# Altium footprint library PcbLibLafe.PcbLib: 297 footprints (part 13 of 19)
Each footprint in its own frame and in the unit in brackets; x right, y up, seen from the top. Pads: shape width x height; smd on the part's side, far side on the other; paste and mask are expansions set on the pad; w line width, h text height; cw(c..) or ccw(c..) is an arc to the next point about the centre after c.
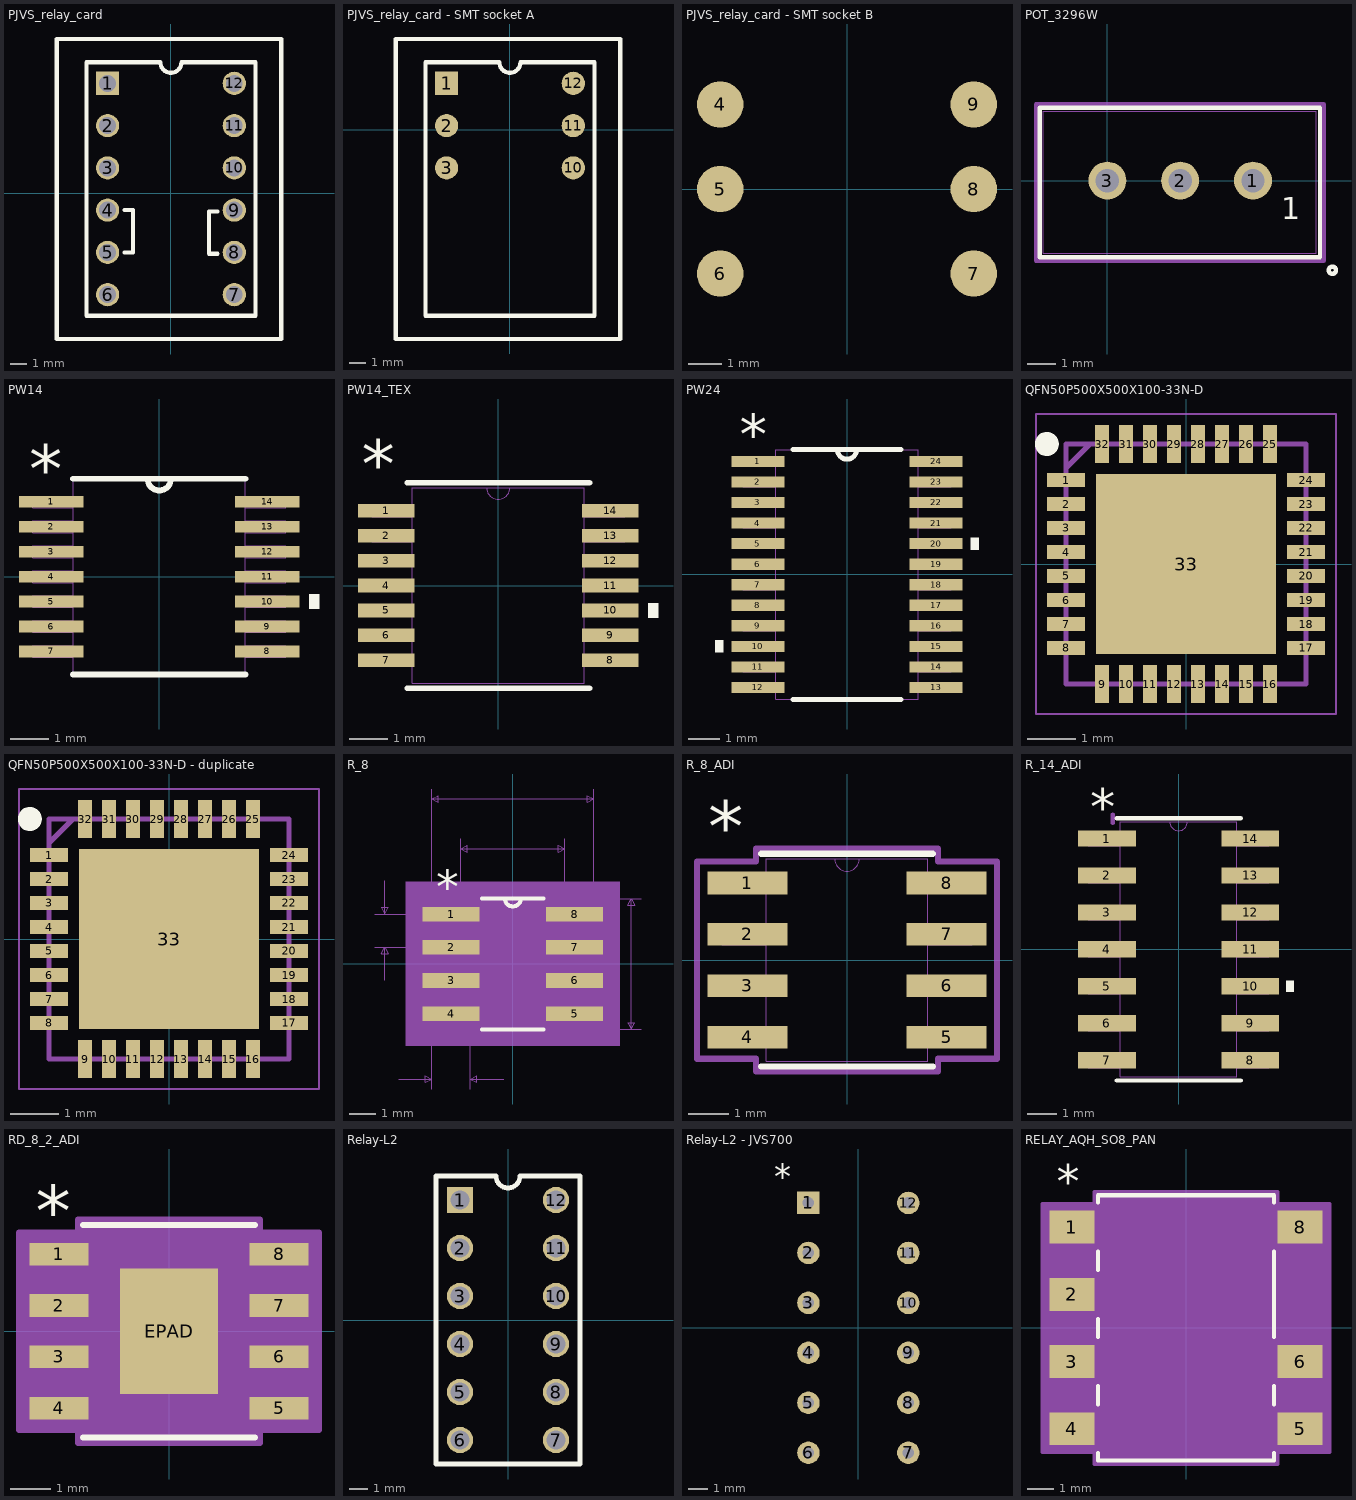
[diagram p12: the footprints below, top view; thin cyan lines are the x and y axes]

## PJVS_relay_card [mil] "PJVS relay card"
pads (12):
  rect 55x55 hole 40: 1(-150,260)
  round 55 hole 40: 2(-150,160) 3(-150,60) 4(-150,-40) 5(-150,-140) 6(-150,-240) 7(150,-240) 8(150,-140) 9(150,-40) 10(150,60) 11(150,160) 12(150,260)
Top Overlay:
  lines w10: -110,-140 -90,-140 -90,-40 -110,-40 ; 110,-143 90,-143 90,-43 110,-43 ; -270,-345 -270,365 261,365 261,-345 -270,-345 ; -200,-290 -200,310 -25,310 ccw(c0,310) 25,310 200,310 200,-290 -200,-290
3D body "110-87-312-41-001101.stp": height 110.28, standoff -179.92, extent -199.21,-294.92 198.43,303.5
3D body "relay_daughter_assm.SLDPRT": height 615.21, standoff -13.4, extent -272,-343 258,367

## PJVS_relay_card - SMT socket A [mil] "PJVS relay card"
pads (6):
  rect 55x55 smd: 1(-150,110)
  round 55 smd: 2(-150,10) 3(-150,-90) 10(150,-90) 11(150,10) 12(150,110)
Top Overlay:
  lines w10: -270,-495 261,-495 261,215 -270,215 -270,-495 ; -200,-440 200,-440 200,160 25,160 cw(c0,160) -25,160 -200,160 -200,-440
3D body "relay_daughter_assm.SLDPRT": height 615.21, standoff -13.4, extent -272,-493 258,217
3D body "110-87-312-41-001101.stp": height 110.28, standoff -179.92, extent -199.21,-444.92 198.43,153.5

## PJVS_relay_card - SMT socket B [mil] "PJVS relay card"
pads (6):
  round 55 smd: 4(-150,100) 5(-150,0) 6(-150,-100) 7(150,-100) 8(150,0) 9(150,100)

## POT_3296W [mil]
pads (3):
  round 52 hole 32 mask+0: 1(200,0) 2(100,0) 3(0,0)
Top Overlay:
  circle w6: c309,-123 r5
  lines w6: -93,-105 -93,100 292,100 292,-105 -93,-105
  text "1" at 239,-53 h30
Mechanical 13:
  lines w1: -88,-100 -88,95 287,95 287,-100 -88,-100
Mechanical 15:
  lines w6: -98,-110 297,-110 297,105 -98,105 -98,-110
3D body "POT_3296W.step": height 402.99, standoff -225, extent -103,-96 272,99
3D body: height 10, standoff 0, extent 0,0 10,10

## PW14 [mil]
pads (14):
  rect 66x12 smd mask+3: 1(-111,76.77) 2(-111,51.18) 3(-111,25.59) 4(-111,0) 5(-111,-25.59) 6(-111,-51.18) 7(-111,-76.77) 8(111,-76.77) 9(111,-51.18) 10(111,-25.59) 11(111,0) 12(111,25.59) 13(111,51.18) 14(111,76.77)
Top Overlay:
  region: 154,-18.09 164,-18.09 164,-33.09 154,-33.09
  lines w6: -88.5,-100.5 88.5,-100.5 ; -88.5,100.5 88.5,100.5 ; -12,100.5 ccw(c0,100.5) 12,100.5
  text "*" at -133.5,85.77 h50
Mechanical 13:
  lines w0: -12,100.5 ccw(c0,100.5) 12,100.5
  lines w1: -130,-82.77 -130,-70.77 -88.5,-70.77 -88.5,-82.77 -130,-82.77 ; -130,-57.18 -130,-45.18 -88.5,-45.18 -88.5,-57.18 -130,-57.18 ; -130,-31.59 -130,-19.59 -88.5,-19.59 -88.5,-31.59 -130,-31.59 ; -130,-6 -130,6 -88.5,6 -88.5,-6 -130,-6 ; -130,19.59 -130,31.59 -88.5,31.59 -88.5,19.59 -130,19.59 ; -130,45.18 -130,57.18 -88.5,57.18 -88.5,45.18 -130,45.18 ; -130,70.77 -130,82.77 -88.5,82.77 -88.5,70.77 -130,70.77 ; -88.5,-100.5 88.5,-100.5 88.5,100.5 -88.5,100.5 -88.5,-100.5 ; 88.5,-82.77 88.5,-70.77 130,-70.77 130,-82.77 88.5,-82.77 ; 88.5,-57.18 88.5,-45.18 130,-45.18 130,-57.18 88.5,-57.18 ; 88.5,-31.59 88.5,-19.59 130,-19.59 130,-31.59 88.5,-31.59 ; 88.5,-6 88.5,6 130,6 130,-6 88.5,-6 ; 88.5,19.59 88.5,31.59 130,31.59 130,19.59 88.5,19.59 ; 88.5,45.18 88.5,57.18 130,57.18 130,45.18 88.5,45.18 ; 88.5,70.77 88.5,82.77 130,82.77 130,70.77 88.5,70.77
  text "*" at -133.5,85.77 h50
3D body: height 10, standoff 0, extent 0,0 10,10
3D body "PW0014A.stp": height 44.49, standoff 0, extent -125.98,-98.42 125.99,98.43

## PW14_TEX [mil]
pads (14):
  rect 58x14 smd paste+0 mask+0: 1(-115,76.77) 2(-115,51.18) 3(-115,25.59) 4(-115,0) 5(-115,-25.59) 6(-115,-51.18) 7(-115,-76.77) 8(115,-76.77) 9(115,-51.18) 10(115,-25.59) 11(115,0) 12(115,25.59) 13(115,51.18) 14(115,76.77)
Top Overlay:
  region: 154,-18.09 164,-18.09 164,-33.09 154,-33.09
  lines w6: -93.5,-105.5 93.5,-105.5 ; -93.5,105.5 93.5,105.5
  text "*" at -140,100 h50
Mechanical 13:
  lines w0: -12,100.5 ccw(c0,100.5) 12,100.5
  lines w1: -130,-82.77 -88.5,-82.77 -88.5,-70.77 -130,-70.77 -130,-82.77 ; -130,-57.18 -88.5,-57.18 -88.5,-45.18 -130,-45.18 -130,-57.18 ; -130,-31.59 -88.5,-31.59 -88.5,-19.59 -130,-19.59 -130,-31.59 ; -130,-6 -88.5,-6 -88.5,6 -130,6 -130,-6 ; -130,19.59 -88.5,19.59 -88.5,31.59 -130,31.59 -130,19.59 ; -130,45.18 -88.5,45.18 -88.5,57.18 -130,57.18 -130,45.18 ; -130,70.77 -88.5,70.77 -88.5,82.77 -130,82.77 -130,70.77 ; -88.5,-100.5 -88.5,100.5 88.5,100.5 88.5,-100.5 -88.5,-100.5 ; 88.5,-82.77 130,-82.77 130,-70.77 88.5,-70.77 88.5,-82.77 ; 88.5,-57.18 130,-57.18 130,-45.18 88.5,-45.18 88.5,-57.18 ; 88.5,-31.59 130,-31.59 130,-19.59 88.5,-19.59 88.5,-31.59 ; 88.5,-6 130,-6 130,6 88.5,6 88.5,-6 ; 88.5,19.59 130,19.59 130,31.59 88.5,31.59 88.5,19.59 ; 88.5,45.18 130,45.18 130,57.18 88.5,57.18 88.5,45.18 ; 88.5,70.77 130,70.77 130,82.77 88.5,82.77 88.5,70.77
3D body "PW14_TEX.step": height 47.09, standoff 0, extent -130,-100.51 130,100.51

## PW24 [mil]
pads (24):
  rect 66x14 smd: 1(-111,140.75) 2(-111,115.16) 3(-111,89.57) 4(-111,63.98) 5(-111,38.39) 6(-111,12.8) 7(-111,-12.8) 8(-111,-38.39) 9(-111,-63.98) 10(-111,-89.57) 11(-111,-115.16) 12(-111,-140.75) 13(111,-140.75) 14(111,-115.16) 15(111,-89.57) 16(111,-63.98) 17(111,-38.39) 18(111,-12.8) 19(111,12.8) 20(111,38.39) 21(111,63.98) 22(111,89.57) 23(111,115.16) 24(111,140.75)
Top Overlay:
  region: -154,-82.07 -164,-82.07 -164,-97.07 -154,-97.07
  region: 154,45.89 164,45.89 164,30.89 154,30.89
  lines w6: -67.44,-155.5 67.44,-155.5 ; -67.44,155.5 67.44,155.5 ; -12,155.5 ccw(c0,155.5) 12,155.5
  text "*" at -133.5,149.75 h50
Mechanical 13:
  lines w0: -12,155.5 ccw(c0,155.5) 12,155.5
  lines w1: -130,-146.75 -130,-134.75 -88.5,-134.75 -88.5,-146.75 -130,-146.75 ; -130,-121.16 -130,-109.16 -88.5,-109.16 -88.5,-121.16 -130,-121.16 ; -130,-95.57 -130,-83.57 -88.5,-83.57 -88.5,-95.57 -130,-95.57 ; -130,-69.98 -130,-57.98 -88.5,-57.98 -88.5,-69.98 -130,-69.98 ; -130,-44.39 -130,-32.39 -88.5,-32.39 -88.5,-44.39 -130,-44.39 ; -130,-18.8 -130,-6.8 -88.5,-6.8 -88.5,-18.8 -130,-18.8 ; -130,6.8 -130,18.8 -88.5,18.8 -88.5,6.8 -130,6.8 ; -130,32.39 -130,44.39 -88.5,44.39 -88.5,32.39 -130,32.39 ; -130,57.98 -130,69.98 -88.5,69.98 -88.5,57.98 -130,57.98 ; -130,83.57 -130,95.57 -88.5,95.57 -88.5,83.57 -130,83.57 ; -130,109.16 -130,121.16 -88.5,121.16 -88.5,109.16 -130,109.16 ; -130,134.75 -130,146.75 -88.5,146.75 -88.5,134.75 -130,134.75 ; -88.5,-155.5 88.5,-155.5 88.5,155.5 -88.5,155.5 -88.5,-155.5 ; 88.5,-146.75 88.5,-134.75 130,-134.75 130,-146.75 88.5,-146.75 ; 88.5,-121.16 88.5,-109.16 130,-109.16 130,-121.16 88.5,-121.16 ; 88.5,-95.57 88.5,-83.57 130,-83.57 130,-95.57 88.5,-95.57 ; 88.5,-69.98 88.5,-57.98 130,-57.98 130,-69.98 88.5,-69.98 ; 88.5,-44.39 88.5,-32.39 130,-32.39 130,-44.39 88.5,-44.39 ; 88.5,-18.8 88.5,-6.8 130,-6.8 130,-18.8 88.5,-18.8 ; 88.5,6.8 88.5,18.8 130,18.8 130,6.8 88.5,6.8 ; 88.5,32.39 88.5,44.39 130,44.39 130,32.39 88.5,32.39 ; 88.5,57.98 88.5,69.98 130,69.98 130,57.98 88.5,57.98 ; 88.5,83.57 88.5,95.57 130,95.57 130,83.57 88.5,83.57 ; 88.5,109.16 88.5,121.16 130,121.16 130,109.16 88.5,109.16 ; 88.5,134.75 88.5,146.75 130,146.75 130,134.75 88.5,134.75
  text "*" at -133.5,149.75 h50
3D body: height 10, standoff 0, extent 0,0 10,10
3D body "PW0024A.stp": height 44.49, standoff 0, extent -125.97,-153.53 125.99,153.55

## QFN50P500X500X100-33N-D [mm]
pads (33):
  rect 0.8x0.3 smd: 1(-2.5,1.75) 2(-2.5,1.25) 3(-2.5,0.75) 4(-2.5,0.25) 5(-2.5,-0.25) 6(-2.5,-0.75) 7(-2.5,-1.25) 8(-2.5,-1.75) 17(2.5,-1.75) 18(2.5,-1.25) 19(2.5,-0.75) 20(2.5,-0.25) 21(2.5,0.25) 22(2.5,0.75) 23(2.5,1.25) 24(2.5,1.75)
  rect 0.3x0.8 smd: 9(-1.75,-2.5) 10(-1.25,-2.5) 11(-0.75,-2.5) 12(-0.25,-2.5) 13(0.25,-2.5) 14(0.75,-2.5) 15(1.25,-2.5) 16(1.75,-2.5) 25(1.75,2.5) 26(1.25,2.5) 27(0.75,2.5) 28(0.25,2.5) 29(-0.25,2.5) 30(-0.75,2.5) 31(-1.25,2.5) 32(-1.75,2.5)
  rect 3.75x3.75 smd: 33(0,0)
Top Overlay:
  circle w0.25: c-2.9,2.5 r0.125
Mechanical 13:
  lines w0.1: -2.5,2 -2,2.5 ; -2.5,-2.5 2.5,-2.5 2.5,2.5 -2.5,2.5 -2.5,-2.5
Mechanical 15:
  lines w0.05: -3.125,-3.125 3.125,-3.125 3.125,3.125 -3.125,3.125 -3.125,-3.125
3D body "AD3551RBCPZ16.stp": height 1, standoff 0, extent -2.55,-2.55 2.55,2.55

## QFN50P500X500X100-33N-D - duplicate [mm]
pads (33):
  rect 0.8x0.3 smd: 1(-2.5,1.75) 2(-2.5,1.25) 3(-2.5,0.75) 4(-2.5,0.25) 5(-2.5,-0.25) 6(-2.5,-0.75) 7(-2.5,-1.25) 8(-2.5,-1.75) 17(2.5,-1.75) 18(2.5,-1.25) 19(2.5,-0.75) 20(2.5,-0.25) 21(2.5,0.25) 22(2.5,0.75) 23(2.5,1.25) 24(2.5,1.75)
  rect 0.3x0.8 smd: 9(-1.75,-2.5) 10(-1.25,-2.5) 11(-0.75,-2.5) 12(-0.25,-2.5) 13(0.25,-2.5) 14(0.75,-2.5) 15(1.25,-2.5) 16(1.75,-2.5) 25(1.75,2.5) 26(1.25,2.5) 27(0.75,2.5) 28(0.25,2.5) 29(-0.25,2.5) 30(-0.75,2.5) 31(-1.25,2.5) 32(-1.75,2.5)
  rect 3.75x3.75 smd: 33(0,0)
Top Overlay:
  circle w0.25: c-2.9,2.5 r0.125
Mechanical 15:
  lines w0.1: -2.5,2 -2,2.5 ; -2.5,-2.5 -2.5,2.5 2.5,2.5 2.5,-2.5 -2.5,-2.5
Mechanical 20:
  lines w0.05: -3.125,-3.125 -3.125,3.125 3.125,3.125 3.125,-3.125 -3.125,-3.125

## R_8 [mil]
pads (8):
  rect 86x22 smd mask+0: 1(-93,75) 2(-93,25) 3(-93,-25) 4(-93,-75) 5(93,-75) 6(93,-25) 7(93,25) 8(93,75)
Top Overlay:
  lines w6: -46.43,-98.5 46.43,-98.5 ; -46.43,98.5 46.43,98.5 ; -12,98.5 ccw(c0,98.5) 12,98.5
  text "*" at -115.5,92 h50
Mechanical 5:
  region: 161,-123.5 -161,-123.5 -161,123.5 161,123.5
Mechanical 7:
  lines w1: -208,25 -93,25 ; -208,75 -93,75 ; -193,-25 -193,25 ; -193,125 -193,75 ; -172,-173.5 -122,-173.5 ; -122,-188.5 -122,0 -122,263.5 ; -78.5,0 -78.5,188.5 ; -64,-188.5 -64,0 ; -14,-173.5 -64,-173.5 ; 0,-98.5 193.5,-98.5 ; 0,98.5 193.5,98.5 ; 78.5,0 78.5,188.5 ; 122,0 122,263.5 ; -193,25 -188,15 -198,15 -193,25 ; -193,75 -188,85 -198,85 -193,75 ; -122,-173.5 -132,-178.5 -132,-168.5 -122,-173.5 ; -122,248.5 -112,243.5 -112,253.5 -122,248.5 ; -122,248.5 122,248.5 ; -78.5,173.5 -68.5,168.5 -68.5,178.5 -78.5,173.5 ; -78.5,173.5 78.5,173.5 ; -64,-173.5 -54,-178.5 -54,-168.5 -64,-173.5 ; 78.5,173.5 68.5,168.5 68.5,178.5 78.5,173.5 ; 122,248.5 112,243.5 112,253.5 122,248.5 ; 178.5,-98.5 183.5,-88.5 173.5,-88.5 178.5,-98.5 ; 178.5,-98.5 178.5,98.5 ; 178.5,98.5 183.5,88.5 173.5,88.5 178.5,98.5
  text ".05in/1.27mm" at -168,-218.5 h25
  text ".05in/1.27mm" at -363,37.5 h25
  text ".197in/5.004mm" at 198.5,-12.5 h25
  text ".244in/6.198mm" at -87.5,268.5 h25
  text ".157in/3.988mm" at -87.5,193.5 h25
  text "Alt 2 Padstyle: OX90Y60D30P" at -337.5,-523.5 h50
  text "Alt 1 Padstyle: OX60Y90D30P" at -337.5,-448.5 h50
  text "Pin One Padstyle: RX86Y22D0TSM2" at -387.5,-373.5 h50
  text "Default Padstyle: RX86Y22D0TSM2" at -387.5,-298.5 h50
Mechanical 13:
  lines w0: -12,98.5 ccw(c0,98.5) 12,98.5
  lines w1: -122,-85 -78.5,-85 -78.5,-65 -122,-65 -122,-85 ; -122,-35 -78.5,-35 -78.5,-15 -122,-15 -122,-35 ; -122,15 -78.5,15 -78.5,35 -122,35 -122,15 ; -122,65 -78.5,65 -78.5,85 -122,85 -122,65 ; -78.5,-98.5 -78.5,98.5 78.5,98.5 78.5,-98.5 -78.5,-98.5 ; 78.5,-85 122,-85 122,-65 78.5,-65 78.5,-85 ; 78.5,-35 122,-35 122,-15 78.5,-15 78.5,-35 ; 78.5,15 122,15 122,35 78.5,35 78.5,15 ; 78.5,65 122,65 122,85 78.5,85 78.5,65
  text "*" at -115.5,92 h50
Mechanical 15:
  region: 146,-108.5 -146,-108.5 -146,108.5 146,108.5
  lines w6: -146,-108.5 146,-108.5 146,108.5 -146,108.5 -146,-108.5
3D body: height 10, standoff 0, extent 0,0 10,10

## R_8_ADI [mil]
pads (8):
  rect 78x22 smd paste+0 mask+0: 1(-97,75) 2(-97,25) 3(-97,-25) 4(-97,-75) 5(97,-75) 6(97,-25) 7(97,25) 8(97,75)
Top Overlay:
  lines w6: -83.5,-103.5 83.5,-103.5 ; -83.5,103.5 83.5,103.5
  text "*" at -135,105 h50
Mechanical 13:
  lines w0: -12,98.5 ccw(c0,98.5) 12,98.5
  lines w1: -122,-85 -122,-65 -78.5,-65 -78.5,-85 -122,-85 ; -122,-35 -122,-15 -78.5,-15 -78.5,-35 -122,-35 ; -122,15 -122,35 -78.5,35 -78.5,15 -122,15 ; -122,65 -122,85 -78.5,85 -78.5,65 -122,65 ; -78.5,-98.5 78.5,-98.5 78.5,98.5 -78.5,98.5 -78.5,-98.5 ; 78.5,-85 78.5,-65 122,-65 122,-85 78.5,-85 ; 78.5,-35 78.5,-15 122,-15 122,-35 78.5,-35 ; 78.5,15 78.5,35 122,35 122,15 78.5,15 ; 78.5,65 78.5,85 122,85 122,65 78.5,65
  text "*" at -76,45.5 h50
Mechanical 15:
  lines w6: -146,-96 -146,96 -88.5,96 -88.5,108.5 88.5,108.5 88.5,96 146,96 146,-96 88.5,-96 88.5,-108.5 -88.5,-108.5 -88.5,-96 -146,-96
3D body "R_8_ADI.step": height 69.09, standoff 0, extent -122.01,-98.5 122.01,98.5

## R_14_ADI [mil]
pads (14):
  rect 78x22 smd paste+0 mask+0: 1(-97,150) 2(-97,100) 3(-97,50) 4(-97,0) 5(-97,-50) 6(-97,-100) 7(-97,-150) 8(97,-150) 9(97,-100) 10(97,-50) 11(97,0) 12(97,50) 13(97,100) 14(97,150)
Top Overlay:
  region: 146,-42.5 156,-42.5 156,-57.5 146,-57.5
  lines w6: -84,-177.5 84,-177.5 ; -84,177.5 84,177.5
  text "*" at -119.5,167 h50
Mechanical 13:
  lines w0: -12,172.5 ccw(c0,172.5) 12,172.5
  lines w1: -122,-160 -122,-140 -79,-140 -79,-160 -122,-160 ; -122,-110 -122,-90 -79,-90 -79,-110 -122,-110 ; -122,-60 -122,-40 -79,-40 -79,-60 -122,-60 ; -122,-10 -122,10 -79,10 -79,-10 -122,-10 ; -122,40 -122,60 -79,60 -79,40 -122,40 ; -122,90 -122,110 -79,110 -79,90 -122,90 ; -122,140 -122,160 -79,160 -79,140 -122,140 ; -79,-172.5 79,-172.5 79,172.5 -79,172.5 -79,-172.5 ; 79,-160 79,-140 122,-140 122,-160 79,-160 ; 79,-110 79,-90 122,-90 122,-110 79,-110 ; 79,-60 79,-40 122,-40 122,-60 79,-60 ; 79,-10 79,10 122,10 122,-10 79,-10 ; 79,40 79,60 122,60 122,40 79,40 ; 79,90 79,110 122,110 122,90 79,90 ; 79,140 79,160 122,160 122,140 79,140
  text "*" at -76.5,119.5 h50
Mechanical 15:
  lines w6: -89,171 -89,182.5
3D body: height 10, standoff 0, extent 0,0 10,10
3D body "R_14_ADI.step": height 69.09, standoff 0, extent -117,-172.51 127.01,172.52

## RD_8_2_ADI [mil]
pads (9):
  rect 57.5x22 smd paste+0 mask+0: 1(-107.25,75) 2(-107.25,25) 3(-107.25,-25) 4(-107.25,-75) 5(107.25,-75) 6(107.25,-25) 7(107.25,25) 8(107.25,75)
  rect 95x122 smd paste-60.5 mask+0: EPAD(0,0)
Top Overlay:
  lines w6: -83.5,-103.5 83.5,-103.5 ; -83.5,103.5 83.5,103.5
  text "*" at -129.75,92 h50
Top Paste:
  region: 43.56,57.06 -43.56,57.06 -43.56,3.94 43.56,3.94
  region: 43.56,-3.94 -43.56,-3.94 -43.56,-57.06 43.56,-57.06
Mechanical 13:
  lines w0: -12,98.5 ccw(c0,98.5) 12,98.5
  lines w1: -122,-85 -122,-65 -78.5,-65 -78.5,-85 -122,-85 ; -122,-35 -122,-15 -78.5,-15 -78.5,-35 -122,-35 ; -122,15 -122,35 -78.5,35 -78.5,15 -122,15 ; -122,65 -122,85 -78.5,85 -78.5,65 -122,65 ; -78.5,-98.5 78.5,-98.5 78.5,98.5 -78.5,98.5 -78.5,-98.5 ; 78.5,-85 78.5,-65 122,-65 122,-85 78.5,-85 ; 78.5,-35 78.5,-15 122,-15 122,-35 78.5,-35 ; 78.5,15 78.5,35 122,35 122,15 78.5,15 ; 78.5,65 78.5,85 122,85 122,65 78.5,65
  text "*" at -76,45.5 h50
Mechanical 15:
  region: -88.5,-96 -146,-96 -146,96 -88.5,96 -88.5,108.5 88.5,108.5 88.5,96 146,96 146,-96 88.5,-96 88.5,-108.5 -88.5,-108.5
  lines w6: -146,-96 -146,96 -88.5,96 -88.5,108.5 88.5,108.5 88.5,96 146,96 146,-96 88.5,-96 88.5,-108.5 -88.5,-108.5 -88.5,-96 -146,-96
3D body "RD_8_2_ADI.step": height 65.12, standoff 0, extent -122.01,-98.5 122.01,98.5

## Relay-L2 [mil] "L2-TXS2L2"
pads (12):
  rect 55x55 hole 40: 1(-100,250)
  round 55 hole 40: 2(-100,150) 3(-100,50) 4(-100,-50) 5(-100,-150) 6(-100,-250) 7(100,-250) 8(100,-150) 9(100,-50) 10(100,50) 11(100,150) 12(100,250)
Top Overlay:
  lines w10: -150,-300 150,-300 150,300 25,300 cw(c0,300) -25,300 -150,300 -150,-300

## Relay-L2 - JVS700 [mil] "L2-TXS2L2"
pads (12):
  rect 45x45 hole 23: 1(-100,250)
  round 45 hole 23: 2(-100,150) 3(-100,50) 4(-100,-50) 5(-100,-150) 6(-100,-250) 7(100,-250) 8(100,-150) 9(100,-50) 10(100,50) 11(100,150) 12(100,250)
Top Overlay:
  text "*" at -168,278 h50

## RELAY_AQH_SO8_PAN [mil]
pads (7):
  rect 67x49 smd paste+0 mask+0: 1(-170,150) 2(-170,50) 3(-170,-50) 4(-170,-150) 5(170,-150) 6(170,-50) 8(170,150)
Top Overlay:
  lines w6: -131,-186.39 -131,-197.5 131,-197.5 131,-186.39 ; -131,-113.61 -131,-86.39 ; -131,-13.61 -131,13.61 ; -131,86.39 -131,113.61 ; -131,186.39 -131,197.5 131,197.5 131,186.39 ; 131,-113.61 131,-86.39 ; 131,-13.61 131,113.61
  text "*" at -192.5,194 h50
Mechanical 13:
  lines w0: -12,192.5 ccw(c0,192.5) 12,192.5
  lines w1: -189.5,-173.5 -189.5,-126.5 -126,-126.5 -126,-173.5 -189.5,-173.5 ; -189.5,-73.5 -189.5,-26.5 -126,-26.5 -126,-73.5 -189.5,-73.5 ; -189.5,26.5 -189.5,73.5 -126,73.5 -126,26.5 -189.5,26.5 ; -189.5,126.5 -189.5,173.5 -126,173.5 -126,126.5 -189.5,126.5 ; -126,-192.5 126,-192.5 126,192.5 -126,192.5 -126,-192.5 ; 126,-173.5 126,-126.5 189.5,-126.5 189.5,-173.5 126,-173.5 ; 126,-73.5 126,-26.5 189.5,-26.5 189.5,-73.5 126,-73.5 ; 126,126.5 126,173.5 189.5,173.5 189.5,126.5 126,126.5
  text "*" at -123.5,139.5 h50
Mechanical 15:
  region: -136,-184.5 -213.5,-184.5 -213.5,184.5 -136,184.5 -136,202.5 136,202.5 136,184.5 213.5,184.5 213.5,-184.5 136,-184.5 136,-202.5 -136,-202.5
  lines w6: -213.5,-184.5 -213.5,184.5 -136,184.5 -136,202.5 136,202.5 136,184.5 213.5,184.5 213.5,-184.5 136,-184.5 136,-202.5 -136,-202.5 -136,-184.5 -213.5,-184.5
3D body "RELAY_AQH_SO8_PAN.step": height 134.09, standoff 0, extent -189.49,-192.52 189.49,192.52